# Altium footprint library ESP32-SIM800C_KIEN.PcbLib: 45 footprints (part 3 of 3)
Each footprint in its own frame and in the unit in brackets; x right, y up, seen from the top. Pads: shape width x height; smd on the part's side, far side on the other; paste and mask are expansions set on the pad; w line width, h text height; cw(c..) or ccw(c..) is an arc to the next point about the centre after c.
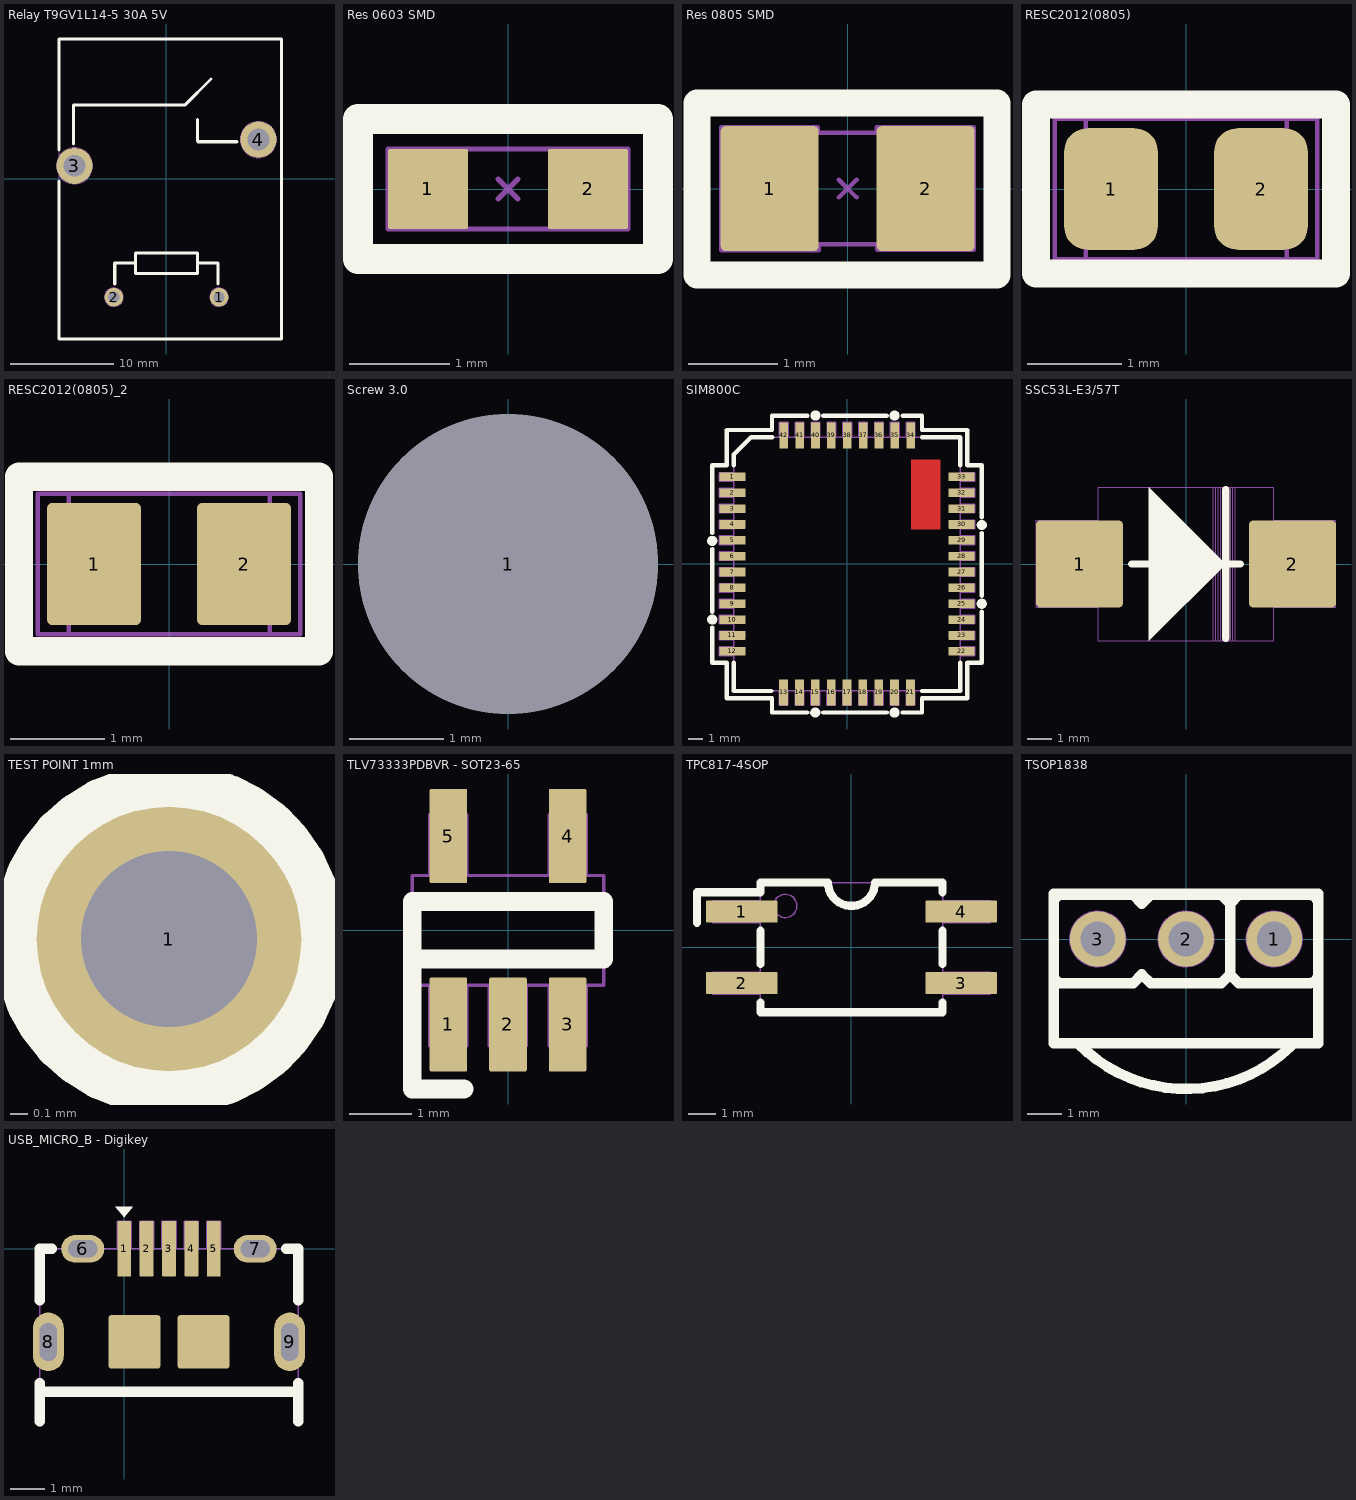
[diagram p2: the footprints below, top view; thin cyan lines are the x and y axes]

## Relay T9GV1L14-5 30A 5V [mm] "Relay T9GV1L14-5 30A 5V CODE FORM C"
height 15.7
pads (4):
  round 1.8 hole 1.1 mask+0.05: 1(5.08,-11.43) 2(-5.08,-11.43)
  round 3.5 hole 2.1 mask+0.05: 3(-8.89,1.27) 4(8.89,3.81)
Top Overlay:
  lines w0.3: -10.37,-0.2 -10.37,-15.47 11.13,-15.47 11.13,13.53 -10.37,13.53 -10.37,2.8 ; -9,3.4 -9,7.16 1.8,7.16 4.3,9.66 ; -5,-10.14 -5,-8.14 -3,-8.14 ; 3,-8.14 5,-8.14 5,-10.14 ; 3,5.76 3,3.66 3.06,3.6 6.8,3.6 ; -3,-9.14 -3,-7.14 3,-7.14 3,-9.14 -3,-9.14
Mechanical 2:
  circle w0.05: c-5.08,-11.43 r0.9
  circle w0.05: c5.08,-11.43 r0.9
  circle w0.05: c8.89,3.81 r1.75
  circle w0.05: c-8.89,1.27 r1.75
  lines w0.05: -10.37,-15.47 11.13,-15.47 11.13,13.53 -10.37,13.53 -10.37,-15.47
  text "2" at -5.3,-12 h0.75
  text "1" at 4.8,-12 h0.75
  text "3" at -9.2,0.8 h0.75
  text "4" at 8.6,3.2 h0.75
3D body: height 15.7, standoff 0, extent -10.37,-15.47 11.13,13.53

## Res 0603 SMD [mm] "Reflow Soldering"
pads (2):
  rrect5% 0.8x0.8 smd mask+0.05: 1(-0.8,0) 2(0.8,0)
Top Overlay:
  lines w0.3: -1.5,-0.7 1.5,-0.7 1.5,0.7 -1.5,0.7 -1.5,-0.7
Mechanical 2:
  lines w0.05: -0.8,-0.4 -1.2,-0.4 -1.2,0.4 -0.8,0.4 ; -0.8,-0.4 -0.8,-0.4 ; -0.8,-0.4 0.8,-0.4 ; -0.8,-0.4 -0.8,0.4 ; -0.8,0.4 0.8,0.4 ; 0.8,-0.4 1.2,-0.4 1.2,0.4 0.8,0.4 ; 0.8,-0.4 0.8,0.4
  text ".Designator" at 0,0 h0.75
Mechanical 15:
  lines w0.05: -0.1,-0.1 0.1,0.1 ; -0.1,0.1 0.1,-0.1 ; -0.8,-0.4 -0.8,0.4 0.8,0.4 0.8,-0.4 -0.8,-0.4
3D body "User Library-SMD RESISTOR-10603.STEP": height 0.48, standoff 0.02, extent -0.8,-0.4 0.8,0.4

## Res 0805 SMD [mm] "Reflow Soldering"
pads (2):
  rrect10% 1.1x1.4 smd mask+0.05: 1(-0.875,0) 2(0.875,0)
Top Overlay:
  lines w0.3: -1.69,-0.97 -1.69,0.96 1.675,0.96 1.675,-0.97 -1.69,-0.97
Mechanical 2:
  lines w0.05: -0.331,0.642 -0.334,0.642 -0.334,0.687 -1.416,0.687 -1.416,-0.69 -1.413,-0.69 -0.327,-0.69 ; -0.325,-0.69 -0.325,-0.632 ; 0.324,0.632 0.324,0.69 ; 0.327,0.69 1.413,0.69 ; 0.334,-0.642 0.334,-0.687 1.416,-0.687 1.416,0.69 ; -1,-0.625 1,-0.625 1,0.625 -1,0.625 -1,-0.625
  text ".Designator" at 0,0 h0.75
Mechanical 15:
  lines w0.05: -0.1,-0.1 0.1,0.1 ; -0.1,0.1 0.1,-0.1 ; -1,-0.625 1,-0.625 1,0.625 -1,0.625 -1,-0.625
3D body "User Library-SMD RESISTOR-10805.STEP": height 0.62, standoff 0.02, extent -1,-0.625 1,0.625

## RESC2012(0805) [mm] "Chip Resistor, Body 2.0x1.3mm, 1/8W 0805"
height 0.65
pads (2):
  rrect50% 1x1.3 smd mask+0.05: 1(-0.8,0) 2(0.8,0)
Top Overlay:
  lines w0.3: -1.6,-0.9 1.6,-0.9 1.6,0.9 -1.6,0.9 -1.6,-0.9
Mechanical 1:
  lines w0.05: -1.07,-0.74 -1.07,0.75 ; 1.075,-0.74 1.075,0.75 ; -1.4,-0.75 1.4,-0.75 1.4,0.75 -1.4,0.75 -1.4,-0.75
3D body "Res 0805.STEP": height 0.6, standoff 0, extent -1,-0.625 1,0.625

## RESC2012(0805)_2 [mm]
pads (2):
  rrect10% 1x1.3 smd mask+0.05: 1(-0.8,0) 2(0.8,0)
Top Overlay:
  lines w0.3: -1.6,-0.93 1.6,-0.93 1.6,0.93 -1.6,0.93 -1.6,-0.93
Mechanical 2:
  lines w0.05: -1.07,-0.74 -1.07,0.75 ; 1.075,-0.74 1.075,0.75 ; -1.4,-0.75 -1.4,0.75 1.4,0.75 1.4,-0.75 -1.4,-0.75
  text ".Designator" at 0,0 h0.75
3D body "Res 0805.STEP": height 0.6, standoff 0, extent -1,-0.625 1,0.625

## Screw 3.0 [mm] "Hole 3.2mm outline 8mm"
height 10
pads (1):
  round 3.2 hole 3.2 mask+0.05: 1(0,0)

## SIM800C [mm]
pads (42):
  rrect5% 1.8x0.6 smd mask+0.05: 1(-7.95,6.039) 2(-7.95,4.939) 3(-7.95,3.839) 4(-7.95,2.739) 5(-7.95,1.639) 6(-7.95,0.539) 7(-7.95,-0.561) 8(-7.95,-1.661) 9(-7.95,-2.761) 10(-7.95,-3.861) 11(-7.95,-4.961) 12(-7.95,-6.061) 22(7.95,-6.061) 23(7.95,-4.961) 24(7.95,-3.861) 25(7.95,-2.761) 26(7.95,-1.661) 27(7.95,-0.561) 28(7.95,0.539) 29(7.95,1.639) 30(7.95,2.739) 31(7.95,3.839) 32(7.95,4.939) 33(7.95,6.039)
  rrect5% 0.6x1.8 smd mask+0.05: 13(-4.4,-8.911) 14(-3.3,-8.911) 15(-2.2,-8.911) 16(-1.1,-8.911) 17(0,-8.911) 18(1.1,-8.911) 19(2.2,-8.911) 20(3.3,-8.911) 21(4.4,-8.911) 34(4.416,8.911) 35(3.316,8.911) 36(2.216,8.911) 37(1.116,8.911) 38(0.016,8.911) 39(-1.084,8.911) 40(-2.184,8.911) 41(-3.284,8.911) 42(-4.384,8.911)
Top Layer:
  pour cut-out: 4.445,7.239 4.445,2.413 6.477,2.413 6.477,7.239
Top Overlay:
  circle w0.5: c-2.2,-10.311 r0.1
  circle w0.5: c9.35,-2.761 r0.1
  circle w0.5: c-9.35,1.601 r0.1
  circle w0.5: c9.35,2.701 r0.1
  circle w0.5: c-2.192,10.3 r0.1
  circle w0.5: c3.3,-10.311 r0.1
  circle w0.5: c-9.35,-3.86 r0.1
  circle w0.5: c3.3,10.289 r0.1
  lines w0.3: -9.35,-4.411 -9.35,-6.861 -8.35,-6.861 -8.35,-9.311 -5.2,-9.311 -5.2,-10.311 -2.75,-10.311 ; -9.35,-3.321 -9.35,1.039 ; -9.35,2.139 -9.35,6.839 -8.35,6.839 ; -8.35,8.789 -8.35,6.839 ; -7.85,-6.861 -7.85,-8.811 -5.25,-8.811 ; -7.85,6.839 -7.85,7.589 -6.65,8.789 -5.192,8.789 ; -2.742,10.289 -5.2,10.289 -5.2,9.289 -8.35,9.289 -8.35,6.839 ; -1.65,-10.311 2.75,-10.311 ; -1.642,10.289 2.75,10.289 ; 3.85,-10.311 5.2,-10.311 5.2,-9.311 8.35,-9.311 8.35,-6.861 9.35,-6.861 ; 3.858,10.289 5.2,10.289 5.2,9.289 8.35,9.289 8.35,6.839 9.35,6.839 ; 5.208,-8.811 7.85,-8.811 7.85,-6.861 ; 5.208,8.789 7.85,8.789 7.85,6.839 ; 9.3,6.839 9.35,6.839 ; 9.325,6.839 9.35,6.839 ; 9.35,-2.211 9.35,2.139 ; 9.35,3.239 9.35,6.839 ; 9.35,-6.861 9.35,-6.861 ; 9.35,-6.861 9.35,-3.321 ; 9.35,-3.321 9.35,-3.321 ; 9.35,2.701 9.35,2.701
Mechanical 2:
  lines w0.1: -7.9,-6.361 -8.85,-6.361 -8.85,-5.761 -7.9,-5.761 ; -7.9,-5.261 -8.85,-5.261 -8.85,-4.661 -7.9,-4.661 ; -7.9,-4.161 -8.85,-4.161 -8.85,-3.561 -7.9,-3.561 ; -7.9,-3.061 -8.85,-3.061 -8.85,-2.461 -7.9,-2.461 ; -7.9,-1.961 -8.85,-1.961 -8.85,-1.361 -7.9,-1.361 ; -7.9,-0.861 -8.85,-0.861 -8.85,-0.261 -7.85,-0.261 ; -7.9,0.239 -8.85,0.239 -8.85,0.839 -7.9,0.839 ; -7.9,1.339 -8.85,1.339 -8.85,1.939 -7.9,1.939 ; -7.9,2.439 -8.85,2.439 -8.85,3.039 -7.9,3.039 ; -7.9,3.539 -8.85,3.539 -8.85,4.139 -7.9,4.139 ; -7.9,4.639 -8.85,4.639 -8.85,5.239 -7.85,5.239 ; -7.9,5.739 -8.85,5.739 -8.85,6.339 -7.9,6.339 ; -4.698,-8.817 -4.698,-9.817 -4.098,-9.817 -4.098,-8.817 ; -4.686,8.817 -4.686,9.817 -4.086,9.817 -4.086,8.817 ; -3.598,-8.817 -3.598,-9.817 -2.998,-9.817 -2.998,-8.817 ; -3.586,8.817 -3.586,9.817 -2.986,9.817 -2.986,8.817 ; -2.498,-8.817 -2.498,-9.817 -1.898,-9.817 -1.898,-8.817 ; -2.486,8.817 -2.486,9.817 -1.886,9.817 -1.886,8.817 ; -1.398,-8.817 -1.398,-9.817 -0.798,-9.817 -0.798,-8.817 ; -1.386,8.817 -1.386,9.817 -0.786,9.817 -0.786,8.817 ; -0.298,-8.817 -0.298,-9.817 0.302,-9.817 0.302,-8.817 ; -0.286,8.817 -0.286,9.817 0.314,9.817 0.314,8.817 ; 0.802,-8.817 0.802,-9.817 1.402,-9.817 1.402,-8.817 ; 0.814,8.817 0.814,9.817 1.414,9.817 1.414,8.817 ; 1.902,-8.817 1.902,-9.817 2.502,-9.817 2.502,-8.817 ; 1.914,8.817 1.914,9.817 2.514,9.817 2.514,8.817 ; 3.002,-8.817 3.002,-9.817 3.602,-9.817 3.602,-8.817 ; 3.014,8.817 3.014,9.817 3.614,9.817 3.614,8.817 ; 4.102,-8.817 4.102,-9.817 4.702,-9.817 4.702,-8.817 ; 4.114,8.817 4.114,9.817 4.714,9.817 4.714,8.817 ; 7.85,-5.261 8.85,-5.261 8.85,-4.661 7.9,-4.661 ; 7.85,0.239 8.85,0.239 8.85,0.839 7.9,0.839 ; 7.9,-6.361 8.85,-6.361 8.85,-5.761 7.9,-5.761 ; 7.9,-4.161 8.85,-4.161 8.85,-3.561 7.9,-3.561 ; 7.9,-3.061 8.85,-3.061 8.85,-2.461 7.9,-2.461 ; 7.9,-1.961 8.85,-1.961 8.85,-1.361 7.9,-1.361 ; 7.9,-0.861 8.85,-0.861 8.85,-0.261 7.9,-0.261 ; 7.9,1.339 8.85,1.339 8.85,1.939 7.9,1.939 ; 7.9,2.439 8.85,2.439 8.85,3.039 7.9,3.039 ; 7.9,3.539 8.85,3.539 8.85,4.139 7.9,4.139 ; 7.9,4.639 8.85,4.639 8.85,5.239 7.9,5.239 ; 7.9,5.739 8.85,5.739 8.85,6.339 7.9,6.339 ; -7.85,-8.811 -7.85,7.589 -6.65,8.789 7.85,8.789 7.85,-8.811 -7.85,-8.811
  text "1" at -7.3,4.211 h0.75
  text "12" at -7.3,-7.889 h0.75
  text "13" at -2.261,-8.3 h0.75
  text "21" at 6.389,-8.3 h0.75
  text "22" at 5.45,-7.939 h0.75
  text "33" at 5.45,4.161 h0.75
  text "34" at 6.439,6.65 h0.75
  text "42" at -2.361,6.65 h0.75
3D body "User Library-SIM800C-1.STEP": height 2.32, standoff -0.02, extent -7.85,-8.837 7.85,8.763

## SSC53L-E3/57T [mm] "DIODE SCHOTTKY 30V 5A DO214AB"
height 2.62
pads (2):
  rrect10% 3.52x3.52 smd mask+0.05: 1(-4.305,0) 2(4.305,0)
Top Overlay:
  region: -1.5,3.1 -1.5,-3.1 1.6,0
  lines w0.3: -2.2,0 2.2,0 ; 1.6,-3 1.6,3
Mechanical 2:
  lines w0.05: -3.555,-1.74 -6.065,-1.74 -6.065,1.76 -3.555,1.76 ; 1.1,-3.1 1.1,3.1 ; 1.2,-3.1 1.2,3.1 ; 1.3,-3.1 1.3,3.1 ; 1.4,-3.1 1.4,3.1 ; 1.5,-3.1 1.5,3.1 ; 1.6,-3.1 1.6,3.1 ; 1.7,-3.1 1.7,3.1 ; 1.8,-3.1 1.8,3.1 ; 1.9,-3.1 1.9,3.1 ; 2,-3.1 2,3.1 ; 3.555,-1.75 6.065,-1.75 6.065,1.76 3.555,1.76 ; -3.555,-3.1 -3.555,3.1 3.555,3.1 3.555,-3.1 -3.555,-3.1
3D body "User Library-DIOM8261X24.step": height 2.4, standoff 0.03, extent -4.065,-3.05 4.065,3.05

## TEST POINT 1mm [mm]
pads (1):
  round 1.5 hole 1 mask+0.05: 1(0,0)
Top Overlay:
  circle w0.3: c0,0 r0.85
Bottom Overlay:
  circle w0.3: c0,0 r0.85
Mechanical 2:
  circle w0.05: c0,0 r0.85

## TLV73333PDBVR - SOT23-65 [mm] "IC REG LINEAR 3.3V 300MA SOT23-5"
height 0.8
pads (5):
  rrect10% 0.6x1.5 smd mask+0.05: 1(-0.95,-1.5) 2(0,-1.5) 3(0.95,-1.5) 4(0.95,1.5) 5(-0.95,1.5)
Top Overlay:
  lines w0.3: -1.525,-0.398 -1.525,-2.528 -0.7,-2.528 ; -1.525,-0.458 1.525,-0.458 1.525,0.459 -1.525,0.459 -1.525,-0.458
Mechanical 2:
  lines w0.05: -1.249,-0.878 -1.249,-1.839 -0.654,-1.839 -0.654,-0.875 ; -1.246,0.875 -1.246,1.839 -0.651,1.839 -0.651,0.878 ; -0.299,-0.878 -0.299,-1.839 0.296,-1.839 0.296,-0.875 ; 0.651,-0.878 0.651,-1.839 1.246,-1.839 1.246,-0.875 ; 0.654,0.875 0.654,1.839 1.249,1.839 1.249,0.878 ; -1.525,-0.875 -1.525,0.875 1.525,0.875 1.525,-0.875 -1.525,-0.875
  text "1" at -1.055,-0.75 h0.75
  text "3" at 0.846,-0.745 h0.75
  text "4" at 0.817,0.374 h0.75
  text "5" at -1.074,0.336 h0.75
3D body "CircuitWorks-SOT-23-5.step": height 1.05, standoff -0.05, extent -1.5,-1.25 1.5,1.25

## TPC817-4SOP [mm] "OPTOISO 5KV TRANS 4SOP"
height 3.68
pads (4):
  rrect10% 2.6x0.8 smd mask+0.05: 1(-3.975,1.295) 2(-3.975,-1.295) 3(3.975,-1.295) 4(3.975,1.295)
Top Overlay:
  lines w0.3: -5.6,0.894 -5.6,2 -3.3,2 -3.3,2.35 -0.85,2.35 ccw(c0,2.35) 0.85,2.35 3.3,2.35 3.3,2 ; -3.3,-2 -3.3,-2.35 3.3,-2.35 3.3,-2 ; -3.3,-0.6 -3.3,0.6 ; 3.3,-0.6 3.3,0.6
Mechanical 2:
  circle w0.05: c-2.4,1.5 r0.424
  lines w0.05: -3.317,-1.695 -5.027,-1.695 -5.027,-0.896 -3.301,-0.896 ; -3.316,0.894 -3.317,0.895 -5.027,0.895 -5.027,1.694 -3.301,1.694 ; -0.85,2.35 ccw(c0,2.35) 0.85,2.35 ; 3.301,-1.694 5.027,-1.694 5.027,-0.895 3.317,-0.895 ; 3.301,0.896 5.027,0.896 5.027,1.695 3.317,1.695 ; -3.3,-2.35 3.3,-2.35 3.3,2.35 -3.3,2.35 -3.3,-2.35
  text "C" at 2.4,0.9 h0.75
  text "A" at -3,0.1 h0.75
  text ".Designator" at 0,0 h0.75
  text "K" at -3,-1.694 h0.75
  text "E" at 2.4,-1.7 h0.75
3D body "User Library-LTV-356T.step": height 2, standoff -0.1, extent -3.5,-1.925 3.5,1.925

## TSOP1838 [mm] "Connector DIP, 3Pin_2.54mm"
height 8.25
pads (3):
  round 1.6 hole 1 mask+0.05: 1(2.54,0) 2(0,0) 3(-2.54,0)
Top Overlay:
  lines w0.3: -3.098,-3.009 ccw(c0,0) 3.012,-3.095 ; -1.524,-1.28 -1.524,-1.27 ; -1.524,1.27 -1.27,1.016 -1.016,1.27 ; -1.524,1.28 -3.57,1.28 ccw(c-3.55,1.02) -3.81,1 -3.81,-1 ccw(c-3.55,-1.02) -3.57,-1.28 -1.534,-1.28 -1.524,-1.27 ; -1.016,1.28 1.016,1.28 ; 1.016,-1.28 -1.016,-1.28 -1.27,-1.026 -1.27,-1.016 -1.524,-1.27 ; 1.016,-1.27 1.27,-1.016 ; 1.016,1.27 1.27,1.016 ; 1.524,1.27 1.27,1.016 ; 1.524,1.28 3.556,1.28 3.556,1.27 ; 3.53,-1.28 ccw(c3.53,-1) 3.81,-1 3.81,1 ccw(c3.53,1) 3.53,1.28 ; 3.556,-1.27 3.556,-1.28 1.524,-1.28 1.27,-1.026 1.27,-1.016 ; -3.81,1.3 -3.81,-3 3.81,-3 3.81,1.3 ; -3.81,1.3 3.81,1.3 ; -3.81,1.3 3.81,1.3 ; 1.27,-1.016 1.27,1.016
Mechanical 1:
  circle w0.05: c0,0 r0.8
  circle w0.05: c-2.54,0 r0.8
  circle w0.05: c2.54,0 r0.8
  lines w0.05: -3.098,-3.009 ccw(c0,0) 3.012,-3.095 ; -3.81,-1 ccw(c-3.55,-1.02) -3.57,-1.28 ; -3.81,-1 ccw(c-3.55,-1.02) -3.57,-1.28 ; -3.81,-1 -3.81,1 ; -3.81,-1 -3.81,1 ; -3.81,1 cw(c-3.55,1.02) -3.57,1.28 ; -3.81,1 cw(c-3.55,1.02) -3.57,1.28 ; -3.81,1.3 3.81,1.3 ; -3.81,1.3 3.81,1.3 ; -3.81,1.3 -3.81,-3 3.81,-3 3.81,1.3 ; -3.57,-1.28 -1.534,-1.28 ; -3.57,-1.28 -1.534,-1.28 ; -3.57,1.28 -1.524,1.28 -3.57,1.28 ; -1.534,-1.28 -1.524,-1.27 ; -1.534,-1.28 -1.524,-1.27 ; -1.524,-1.27 -1.524,-1.28 -1.524,-1.27 ; -1.524,-1.27 -1.27,-1.016 ; -1.524,-1.27 -1.27,-1.016 ; -1.27,-1.026 -1.27,-1.016 ; -1.27,-1.026 -1.016,-1.28 ; -1.27,-1.026 -1.27,-1.016 ; -1.27,-1.026 -1.016,-1.28 ; -1.27,1.016 -1.524,1.27 -1.27,1.016 ; -1.27,1.016 -1.016,1.27 -1.27,1.016 ; -1.016,-1.28 1.016,-1.28 -1.016,-1.28 ; 1.27,-1.026 1.524,-1.28 ; 1.27,-1.026 1.27,-1.016 ; 1.27,-1.026 1.524,-1.28 ; 1.27,-1.026 1.27,-1.016 ; 1.27,-1.016 1.27,1.016 ; 1.27,-1.016 1.016,-1.27 1.27,-1.016 ; 1.27,1.016 1.524,1.27 1.27,1.016 ; 1.27,1.016 1.016,1.27 1.27,1.016 ; 1.524,-1.28 3.556,-1.28 ; 1.524,-1.28 3.556,-1.28 ; 3.556,-1.28 3.556,-1.27 3.556,-1.28 ; 3.556,1.28 3.556,1.27 3.556,1.28 ; 3.556,1.28 1.524,1.28 3.556,1.28 ; 3.81,-1 cw(c3.53,-1) 3.53,-1.28 ccw(c3.53,-1) 3.81,-1 ; 3.81,-1 3.81,1 ; 3.81,-1 3.81,1 ; 3.81,1 ccw(c3.53,1) 3.53,1.28 cw(c3.53,1) 3.81,1 ; -1.016,1.28 1.016,1.28 -1.016,1.28
  text "1" at 2.286,-0.254 h0.75
  text "3" at -2.794,-0.254 h0.75
  text "OUT" at -3.5,-2.7 h0.75
  text "VCC" at 0.9,-2.7 h0.75
  text "GND" at 0.5,-4.2 h0.75
3D body "User Library-TSOP34438.STEP": height 8.95, standoff -3.6, extent -3,-4.05 3,1.55

## USB_MICRO_B - Digikey [mm] "USB_MICRO_B, 609-4618-1-ND"
height 3
pads (11):
  rrect10% 0.4x1.6 smd mask+0.05: 1(0,0) 2(0.65,0) 3(1.3,0) 4(1.95,0) 5(2.6,0)
  oval 1.25x0.8 hole 0.85 slot 0.5 at 90 deg mask+0.05: 6(-1.2,0) 7(3.8,0)
  oval 0.9x1.7 hole 0.5 slot 1.1 at 90 deg mask+0.05: 8(-2.2,-2.7) 9(4.8,-2.7)
  rrect10% 1.5x1.55 smd mask+0.05: ""(0.3,-2.7) ""(2.3,-2.7)
Top Overlay:
  region: 0,0.914 -0.254,1.219 0.254,1.219
  lines w0.3: -2.45,-5 -2.45,-3.9 ; -2.45,-4.15 5.05,-4.15 ; -2.45,-1.5 -2.45,0 -2.1,0 ; 4.7,0 5.05,0 5.05,-1.5 ; 5.05,-5 5.05,-3.9
Mechanical 2:
  lines w0.05: -2.45,-5 -2.45,0 5.05,0 5.05,-5 ; -2.45,-4.15 5.05,-4.15 ; -0.2,0 -0.2,0.8 0.2,0.8 0.2,0 ; 0.45,0 0.45,0.8 0.85,0.8 0.85,0 ; 1.1,0 1.1,0.8 1.5,0.8 1.5,0 ; 1.75,0 1.75,0.8 2.15,0.8 2.15,0 ; 2.4,0 2.4,0.8 2.8,0.8 2.8,0
  text "1" at -0.1,-1 h0.75
  text "5" at 2.3,-1 h0.75
  text ".Designator" at 0.4,-2.2 h0.75
3D body "usb micro b.stp": height 2.61, standoff -0.8, extent -2.45,-5 5.05,0.295